# Altium footprint library laihi.PcbLib: 222 footprints (part 8 of 14)
Each footprint in its own frame and in the unit in brackets; x right, y up, seen from the top. Pads: shape width x height; smd on the part's side, far side on the other; paste and mask are expansions set on the pad; w line width, h text height; cw(c..) or ccw(c..) is an arc to the next point about the centre after c.
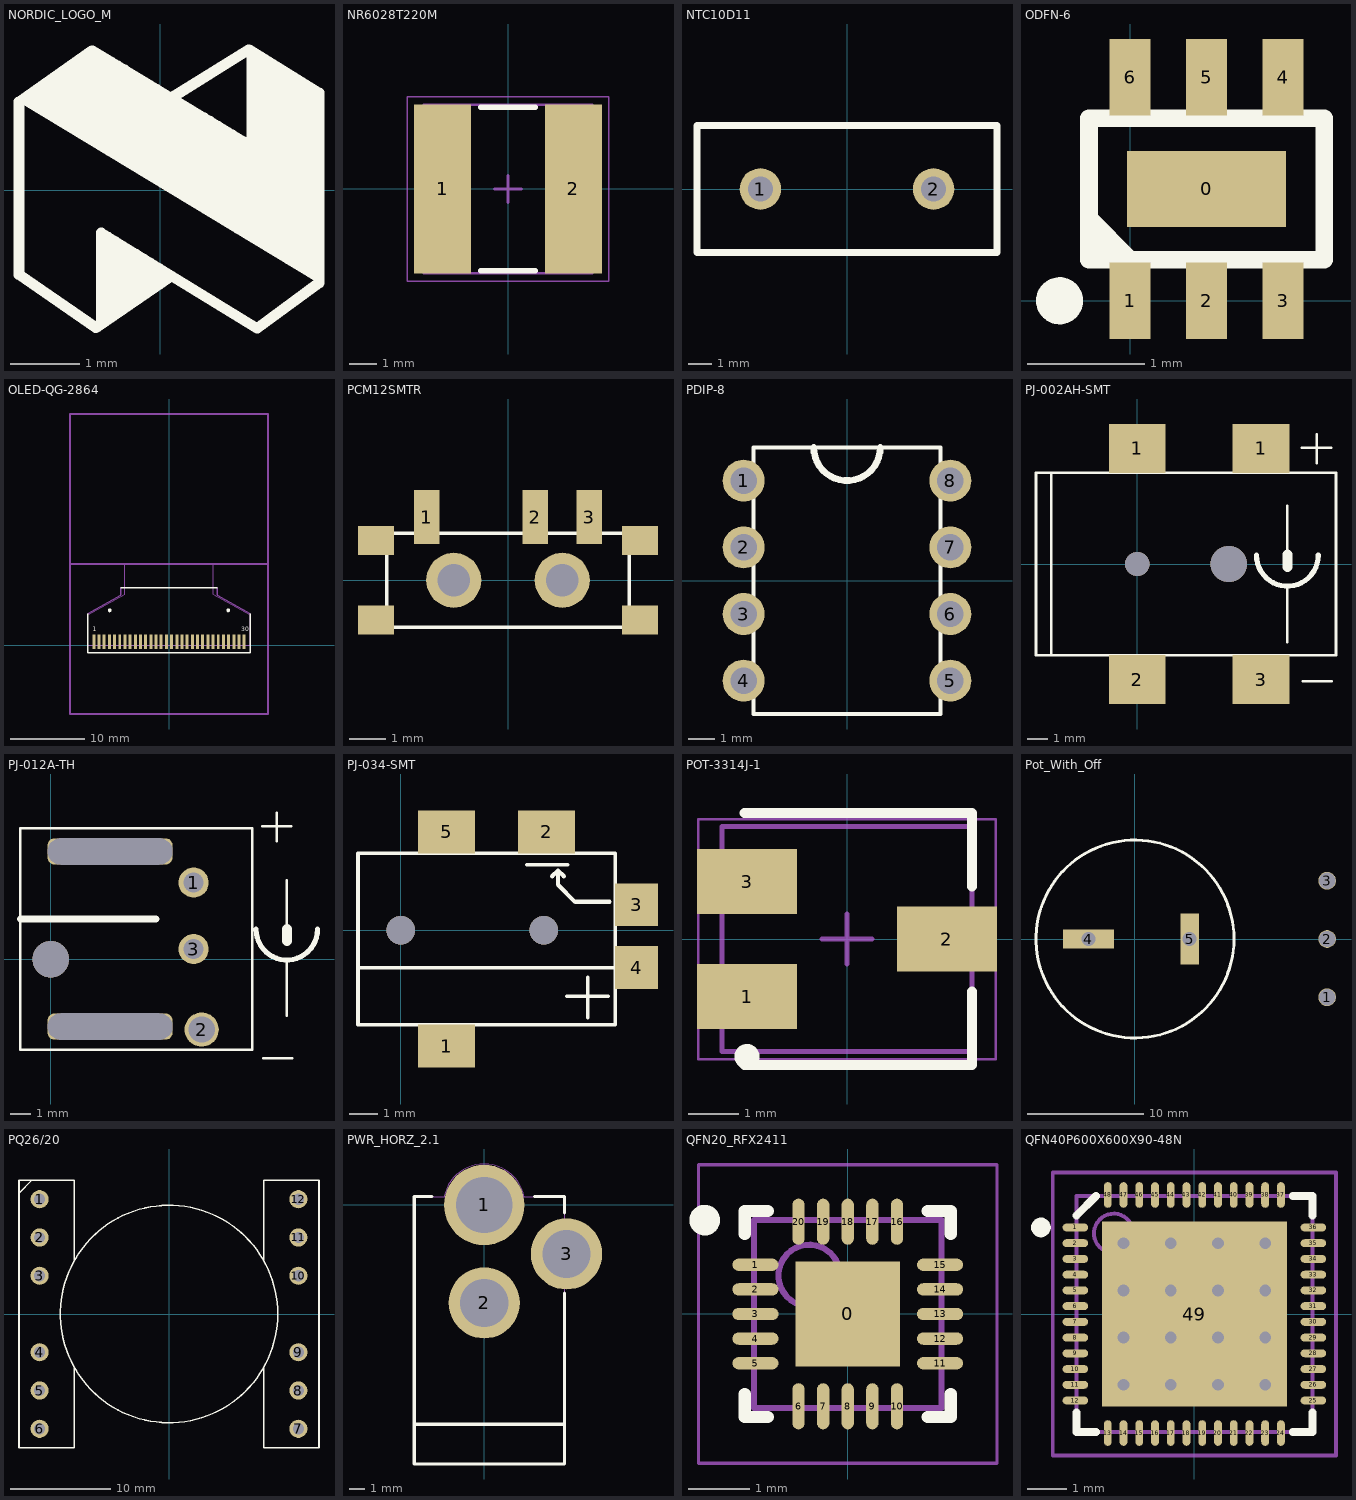
[diagram p7: the footprints below, top view; thin cyan lines are the x and y axes]

## NORDIC_LOGO_M [mm]
Top Overlay:
  lines w0.152: -1.94,1.3 2.276,-1.25 ; -1.857,1.25 -0.876,1.93 ; -1.768,1.203 -0.788,1.891 ; -1.683,1.147 -0.697,1.839 ; -1.602,1.098 -0.615,1.79 ; -1.502,1.036 -0.515,1.729 ; -1.399,0.979 -0.417,1.668 ; -1.32,0.925 -0.332,1.619 ; -1.223,0.868 -0.237,1.56 ; -1.136,0.825 -0.157,1.512 ; -1.039,0.759 -0.055,1.449 ; -0.937,0.696 0.05,1.389 ; -0.93,-1.97 -2.03,-1.209 -2.03,1.27 -0.98,2.007 1.26,0.66 0.254,-0.025 ; -0.9,-1.956 0.16,-1.23 ; -0.85,-1.915 -0.85,-0.61 1.39,-1.98 2.276,-1.33 ; -0.832,0.633 0.17,1.336 ; -0.76,-1.85 -0.76,-0.668 ; -0.734,0.572 0.253,1.265 ; -0.64,-1.77 -0.64,-0.74 ; -0.638,0.517 0.343,1.205 ; -0.545,-1.71 -0.545,-0.8 ; -0.54,0.46 0.441,1.149 ; -0.461,0.411 0.523,1.102 ; -0.447,-1.64 -0.447,-0.86 ; -0.357,0.346 0.63,1.039 ; -0.35,-1.579 -0.35,-0.92 ; -0.274,0.295 0.714,0.988 ; -0.23,-1.497 -0.23,-0.99 ; -0.157,0.226 0.829,0.919 ; -0.14,-1.435 -0.14,-1.044 ; -0.052,0.163 0.933,0.855 ; -0.01,-1.346 -0.01,-1.124 ; 0.048,0.103 1.033,0.795 ; 0.138,0.044 1.144,0.711 ; 0.16,1.33 1.27,2.02 2.276,1.4 ; 0.22,-0.006 1.2,0.696 ; 0.305,-0.051 1.312,0.673 2.276,0.08 ; 0.426,-0.125 1.42,0.573 ; 0.534,-0.185 1.524,0.51 ; 0.635,-0.253 1.63,0.446 ; 0.741,-0.322 1.74,0.379 ; 0.836,-0.374 1.83,0.324 ; 0.932,-0.423 1.92,0.27 ; 1,-0.47 1.985,0.23 ; 1.103,-0.54 2.1,0.16 ; 1.238,-0.618 2.232,0.08 ; 1.31,0.73 1.31,1.99 ; 1.312,0.723 2.276,0.13 ; 1.312,0.853 2.276,0.26 ; 1.312,0.943 2.276,0.35 ; 1.312,1.073 2.276,0.48 ; 1.312,1.193 2.276,0.6 ; 1.312,1.273 2.276,0.68 ; 1.312,1.413 2.276,0.82 ; 1.312,1.533 2.276,0.94 ; 1.312,1.653 2.276,1.06 ; 1.312,1.743 2.276,1.15 ; 1.312,1.883 2.276,1.29 ; 1.325,-0.671 2.276,0.008 ; 1.435,-0.738 2.276,-0.136 ; 1.549,-0.809 2.276,-0.287 ; 1.645,-0.865 2.276,-0.411 ; 1.733,-0.916 2.276,-0.527 ; 1.829,-0.978 2.276,-0.651 ; 1.911,-1.028 2.276,-0.759 ; 2.025,-1.095 2.276,-0.908 ; 2.144,-1.166 2.276,-1.062 ; 2.276,-1.32 2.276,1.396

## NR6028T220M [mm] "SMD power inductor NR series TAIYO YUDEN"
height 2.8
pads (2):
  rect 2.09x6.22 smd: 1(-2.41,0) 2(2.41,0)
Top Overlay:
  lines w0.2: -1,-3.01 1,-3.01 ; -1,3.01 1,3.01
Mechanical 13:
  lines w0.1: -3.1,-3.1 3.1,-3.1 3.1,3.1 -3.1,3.1 -3.1,-3.1
Mechanical 15:
  lines w0.05: -3.7,-3.4 3.7,-3.4 3.7,3.4 -3.7,3.4 -3.7,-3.4
  lines w0.1: -0.5,0 0.5,0 ; 0,-0.5 0,0.5
3D body: height 2.8, standoff 0, extent 1.6,-3.1 3.1,3.1
3D body: height 2.8, standoff 0, extent -3.1,-3.1 -1.6,3.1
3D body: height 2.8, standoff 0, extent -1.6,-3.1 1.6,3.1

## NTC10D11 [mm] "NTC resistor 13mm x 7.5mm 3A"
height 21
pads (2):
  round 1.8 hole 1.1: 1(-3.75,0) 2(3.75,0)
Top Overlay:
  lines w0.3: -6.5,-2.75 6.5,-2.75 6.5,2.75 -6.5,2.75 -6.5,-2.75

## ODFN-6 [mm]
pads (7):
  rect 1.35x0.65 smd: 0(0.65,0.95)
  rect 0.35x0.65 smd: 1(0,0) 2(0.65,0) 3(1.3,0) 4(1.3,1.9) 5(0.65,1.9) 6(0,1.9)
Top Overlay:
  circle w0.2: c-0.6,0 r0.1
  lines w0.1: 0,0.35 0,0.35
  lines w0.15: -0.35,0.6 -0.1,0.35 ; -0.35,0.7 0,0.35 ; -0.35,0.35 1.65,0.35 1.65,1.55 -0.35,1.55 -0.35,0.35
3D body "User Library-SC70-6.step": height 0.92, standoff -0.03, extent -0.35,-0.1 1.65,2

## OLED-QG-2864 [mm] "QG-2864KSWEG01 AllVision 30pin connection"
height 1.5
pads (30):
  rect 0.4x2 smd: 1(-10.15,0.5) 2(-9.45,0.5) 3(-8.75,0.5) 4(-8.05,0.5) 5(-7.35,0.5) 6(-6.65,0.5) 7(-5.95,0.5) 8(-5.25,0.5) 9(-4.55,0.5) 10(-3.85,0.5) 11(-3.15,0.5) 12(-2.45,0.5) 13(-1.75,0.5) 14(-1.05,0.5) 15(-0.35,0.5) 16(0.35,0.5) 17(1.05,0.5) 18(1.75,0.5) 19(2.45,0.5) 20(3.15,0.5) 21(3.85,0.5) 22(4.55,0.5) 23(5.25,0.5) 24(5.95,0.5) 25(6.65,0.5) 26(7.35,0.5) 27(8.05,0.5) 28(8.75,0.5) 29(9.45,0.5) 30(10.15,0.5)
Top Overlay:
  circle w0.25: c-8,4.75 r0.141
  circle w0.25: c8,4.75 r0.141
  lines w0.2: -11,4.275 -11,-0.975 11,-0.975 11,4.275 ; -6.5,7.8 6.5,7.8
  text "1" at -10.275,1.9 h0.6
  text "30" at 9.75,1.95 h0.6
Bottom Overlay:
  lines w0.305: -13.35,-9.25 -13.35,11 13.35,11 13.35,-9.25 -13.35,-9.25
Mechanical 1:
  lines w0.2: -11,4.275 -6.5,6.8 -6.5,7.8 ; 6.5,7.8 6.5,6.8 11,4.275
  lines w0.305: -13.35,11 13.35,11 ; -13.35,11 -13.35,31.25 13.35,31.25 13.35,11 ; -13.35,11 -13.35,-9.25 13.35,-9.25 13.35,11
Mechanical 13:
  lines w0.025: -11,0 -11,4.175 -6,6.9 -6,11 6,11 6,6.9 11,4.175 11,0 -11,0

## PCM12SMTR [mm]
pads (9):
  rect 0.7x1.5 smd: 1(-2.25,1.75) 2(0.75,1.75) 3(2.25,1.75)
  rect 1x0.8 smd: ""(-3.65,-1.1) ""(-3.65,1.1) ""(3.65,-1.1) ""(3.65,1.1)
  round 1.524 hole 0.9: ""(-1.5,0)
  round 1.524 hole 0.9 paste+0 mask+0.102: ""(1.5,0)
Top Overlay:
  lines w0.1: -3.35,-1.3 3.35,-1.3 3.35,1.3 -3.35,1.3 -3.35,-1.3

## PDIP-8 [mm] "PDIP-8 pins 2.54mm pitch"
height 5.33
pads (8):
  round 1.6 hole 1: 1(-3.937,3.81) 2(-3.937,1.27) 3(-3.937,-1.27) 4(-3.937,-3.81) 5(3.937,-3.81) 6(3.937,-1.27) 7(3.937,1.27) 8(3.937,3.81)
Top Overlay:
  lines w0.152: -3.556,-5.08 -3.556,5.08 3.556,5.08 3.556,-5.08 -3.556,-5.08
  lines w0.254: -1.27,5.08 ccw(c0,5.08) 1.27,5.08

## PJ-002AH-SMT [mm] "PWR JACK 5A 16V SMT"
height 11
pads (4):
  rect 2.8x2.4 smd: 1(0,5.7) 1(6.1,5.7) 2(0,-5.7) 3(6.1,-5.7)
via 0,0 diameter 1.2 hole 1.2
via 4.5,0 diameter 1.8 hole 1.8
Top Overlay:
  lines w0.125: -4.42,4.5 -4.242,4.5 -4.242,-4.5 ; 7.403,-3.861 7.403,-1.092 ; 7.403,-0.152 7.403,2.87 ; 8.107,5.74 9.555,5.74 ; 8.153,-5.791 9.601,-5.791 ; 8.839,4.978 8.839,6.401 ; -5,-4.5 -5,4.5 9.8,4.5 9.8,-4.5 -5,-4.5
  lines w0.254: 5.878,0.432 ccw(c7.403,0.432) 8.927,0.432
  lines w0.5: 7.403,-0.152 7.403,0.457

## PJ-012A-TH [mm] "PWR JACK 5A 16V Through Hole"
height 7
pads (5):
  round 1.5 hole 1: 1(7.1,3.8) 3(7.1,0.5)
  round 1.7 hole 1.3: 2(7.5,-3.5)
  rrect50% 6.2x1.3 hole 1.3 slot 6.2 at 0 deg: ""(2.95,-3.35) ""(2.95,5.35)
via 0,0 diameter 1.8 hole 1.8
Top Overlay:
  lines w0.125: 10.507,6.607 11.955,6.607 ; 10.553,-4.925 12.001,-4.925 ; 11.239,5.845 11.239,7.267 ; 11.728,-2.811 11.728,-0.042 ; 11.728,0.898 11.728,3.92 ; -1.5,-4.5 -1.5,6.5 10,6.5 10,-4.5 -1.5,-4.5
  lines w0.254: 10.203,1.482 ccw(c11.728,1.482) 13.252,1.482
  lines w0.35: -1.5,2 5.225,2
  lines w0.5: 11.728,0.898 11.728,1.507

## PJ-034-SMT [mm] "PWR JACK 24V SMT 0.65mm center pin 2.8mm hole"
height 3
pads (5):
  rect 2x1.5 smd: 1(1.6,-4.05) 2(5.1,3.45) 5(1.6,3.45)
  rect 1.5x1.5 smd: 3(8.25,0.9) 4(8.25,-1.3)
via 0,0 diameter 1 hole 1
via 5,0 diameter 1 hole 1
Top Overlay:
  lines w0.125: -1.5,-1.3 7.5,-1.3 ; 4.4,2.3 5.848,2.3 ; 5.807,-2.3 7.255,-2.3 ; 6.539,-3.062 6.539,-1.64 ; -1.5,-3.3 -1.5,2.7 7.5,2.7 7.5,-3.3 -1.5,-3.3
  lines w0.15: 5.3,1.9 5.5,2.1 ; 5.7,1.9 5.5,2.1 ; 7.3,1 6.1,1 5.5,1.6 5.5,2.1 ; 5.5,2.1 5.5,2.1

## POT-3314J-1 [mm] "BOURNS SMT POT 3-Leads, Body 4.50x5.10mm, Pitch 1.15mm, IPC Medium Density"
height 2.55
pads (3):
  rect 2x1.3 smd: 1(-2,-1.15) 2(2,0) 3(-2,1.15)
Top Overlay:
  circle w0.25: c-2,-2.35 r0.125
  lines w0.2: -2.05,-2.525 2.5,-2.525 2.5,-1.05 ; -2.05,2.525 2.5,2.525 2.5,1.05
Mechanical 13:
  lines w0.1: -2.5,-2.25 2.5,-2.25 2.5,2.25 -2.5,2.25 -2.5,-2.25
Mechanical 15:
  lines w0.05: -2.975,-2.4 2.975,-2.4 2.975,2.4 -2.975,2.4 -2.975,-2.4
  lines w0.1: -0.5,0 0.5,0 ; 0,-0.5 0,0.5
3D body: height 2.55, standoff 0, extent -2.5,-2.25 2.5,2.25

## Pot_With_Off [mm]
height 10
pads (5):
  round 1.524 hole 1.4: 1(16.5,-5) 2(16.5,0) 3(16.5,5)
  rect 4.4x1.6 hole 1.2 square: 4(-4,0)
  rect 1.6x4.4 hole 1.2 square: 5(4.7,0)
Top Overlay:
  circle w0.254: c0,0 r8.5

## PQ26/20 [mm] "Transformer 6-6 pins"
height 19.4
pads (12):
  round 1.8 hole 1.1: 1(-12.85,11.4) 2(-12.85,7.6) 3(-12.85,3.8) 4(-12.85,-3.8) 5(-12.85,-7.6) 6(-12.85,-11.4) 7(12.85,-11.4) 8(12.85,-7.6) 9(12.85,-3.8) 10(12.85,3.8) 11(12.85,7.6) 12(12.85,11.4)
Top Overlay:
  circle w0.152: c0,0 r10.8
  lines w0.15: -14.9,12 -13.6,13.3 ; -9.4,-5.3 -9.4,-13.3 -14.9,-13.3 -14.9,13.3 -9.4,13.3 -9.4,5.3 ; 9.4,-5.3 9.4,-13.3 14.9,-13.3 14.9,13.3 9.4,13.3 9.4,5.3

## PWR_HORZ_2.1 [mm]
pads (3):
  round 5.08 hole 3.56: 1(0,0)
  round 4.5 hole 3.05: 2(0,-6.198) 3(5.207,-3.099)
Top Overlay:
  lines w0.203: -4.42,-13.843 -4.42,-16.383 5.08,-16.383 5.08,-13.843 ; -3.302,0.533 -4.42,0.533 -4.42,-13.868 5.08,-13.868 5.08,-5.588 ; 3.175,0.533 5.08,0.533 5.08,-0.508
Mechanical 13:
  lines w0.025: -2.543,0.494 cw(c0,0) 2.543,0.494 ; 5.065,-5.13 ccw(c5.207,-3.099) 5.065,-1.068 ; -4.445,-13.843 5.08,-13.843 ; -4.445,-13.843 -4.445,0.508 5.08,0.508 5.08,-13.843 ; -4.445,-13.843 -4.445,-16.383 5.08,-16.383 5.08,-13.843

## QFN20_RFX2411 [mm] "Power Amplifier RFX2411 with bypass PA and LNA"
height 0.6
pads (21):
  rect 1.7x1.7 smd: 0(0,0)
  oval 0.75x0.2 smd: 1(-1.5,0.8) 2(-1.5,0.4) 3(-1.5,0) 4(-1.5,-0.4) 5(-1.5,-0.8) 11(1.5,-0.8) 12(1.5,-0.4) 13(1.5,0) 14(1.5,0.4) 15(1.5,0.8)
  oval 0.2x0.75 smd: 6(-0.8,-1.5) 7(-0.4,-1.5) 8(0,-1.5) 9(0.4,-1.5) 10(0.8,-1.5) 16(0.8,1.5) 17(0.4,1.5) 18(0,1.5) 19(-0.4,1.5) 20(-0.8,1.5)
Top Overlay:
  circle w0.25: c-2.325,1.525 r0.125
  lines w0.2: -1.675,-1.3 -1.675,-1.675 -1.3,-1.675 ; -1.675,1.3 -1.675,1.675 -1.3,1.675 ; 1.3,-1.675 1.675,-1.675 1.675,-1.3 ; 1.3,1.675 1.675,1.675 1.675,1.3
Mechanical 13:
  circle w0.1: c-0.625,0.625 r0.5
  lines w0.1: -1.525,-1.525 1.525,-1.525 1.525,1.525 -1.525,1.525 -1.525,-1.525
Mechanical 15:
  lines w0.05: -2.425,-2.425 2.425,-2.425 2.425,2.425 -2.425,2.425 -2.425,-2.425
  lines w0.1: -0.5,0 0.5,0 ; 0,-0.5 0,0.5
3D body "QFN20_RFX2411.step": height 0.6, standoff 0, extent -1.575,-1.575 1.575,1.575

## QFN40P600X600X90-48N [mm] "QFN, 48-Leads, Body 6,0x6,0mm (max), Pitch 0,40mm, IPC Medium Density"
height 0.9
pads (49):
  oval 0.65x0.2 smd mask+0.076: 1(-3.025,2.2) 2(-3.025,1.8) 3(-3.025,1.4) 4(-3.025,1) 5(-3.025,0.6) 6(-3.025,0.2) 7(-3.025,-0.2) 8(-3.025,-0.6) 9(-3.025,-1) 10(-3.025,-1.4) 11(-3.025,-1.8) 12(-3.025,-2.2) 25(3.025,-2.2) 26(3.025,-1.8) 27(3.025,-1.4) 28(3.025,-1) 29(3.025,-0.6) 30(3.025,-0.2) 31(3.025,0.2) 32(3.025,0.6) 33(3.025,1) 34(3.025,1.4) 35(3.025,1.8) 36(3.025,2.2)
  oval 0.2x0.65 smd mask+0.076: 13(-2.2,-3.025) 14(-1.8,-3.025) 15(-1.4,-3.025) 16(-1,-3.025) 17(-0.6,-3.025) 18(-0.2,-3.025) 19(0.2,-3.025) 20(0.6,-3.025) 21(1,-3.025) 22(1.4,-3.025) 23(1.8,-3.025) 24(2.2,-3.025) 37(2.2,3.025) 38(1.8,3.025) 39(1.4,3.025) 40(1,3.025) 41(0.6,3.025) 42(0.2,3.025) 43(-0.2,3.025) 44(-0.6,3.025) 45(-1,3.025) 46(-1.4,3.025) 47(-1.8,3.025) 48(-2.2,3.025)
  rect 4.7x4.7 smd mask+0.076: 49(0,0)
via 1.8,-1.8 diameter 0.6 hole 0.3
via 0.6,-1.8 diameter 0.6 hole 0.3
via -0.6,-1.8 diameter 0.6 hole 0.3
via -1.8,-1.8 diameter 0.6 hole 0.3
via 1.8,-0.6 diameter 0.6 hole 0.3
via 0.6,-0.6 diameter 0.6 hole 0.3
via -0.6,-0.6 diameter 0.6 hole 0.3
via -1.8,-0.6 diameter 0.6 hole 0.3
via 1.8,0.6 diameter 0.6 hole 0.3
via 0.6,0.6 diameter 0.6 hole 0.3
via -0.6,0.6 diameter 0.6 hole 0.3
via -1.8,0.6 diameter 0.6 hole 0.3
via 1.8,1.8 diameter 0.6 hole 0.3
via 0.6,1.8 diameter 0.6 hole 0.3
via -0.6,1.8 diameter 0.6 hole 0.3
via -1.8,1.8 diameter 0.6 hole 0.3
Top Overlay:
  circle w0.25: c-3.9,2.2 r0.125
  lines w0.2: -3,-2.5 -3,-3 -2.5,-3 ; -3,2.5 -2.5,3 ; 2.5,-3 3,-3 3,-2.5 ; 2.5,3 3,3 3,2.5
Mechanical 13:
  circle w0.1: c-2.05,2.05 r0.5
  lines w0.1: -3,-3 3,-3 3,3 -3,3 -3,-3
Mechanical 15:
  lines w0.1: -0.5,0 0.5,0 ; 0,-0.5 0,0.5 ; -3.6,-3.6 3.6,-3.6 3.6,3.6 -3.6,3.6 -3.6,-3.6
3D body: height 0.9, standoff 0, extent -3,-3 3,3